# Altium footprint library Inverter_2kW.PcbLib: 61 footprints (part 4 of 4)
Each footprint in its own frame and in the unit in brackets; x right, y up, seen from the top. Pads: shape width x height; smd on the part's side, far side on the other; paste and mask are expansions set on the pad; w line width, h text height; cw(c..) or ccw(c..) is an arc to the next point about the centre after c.
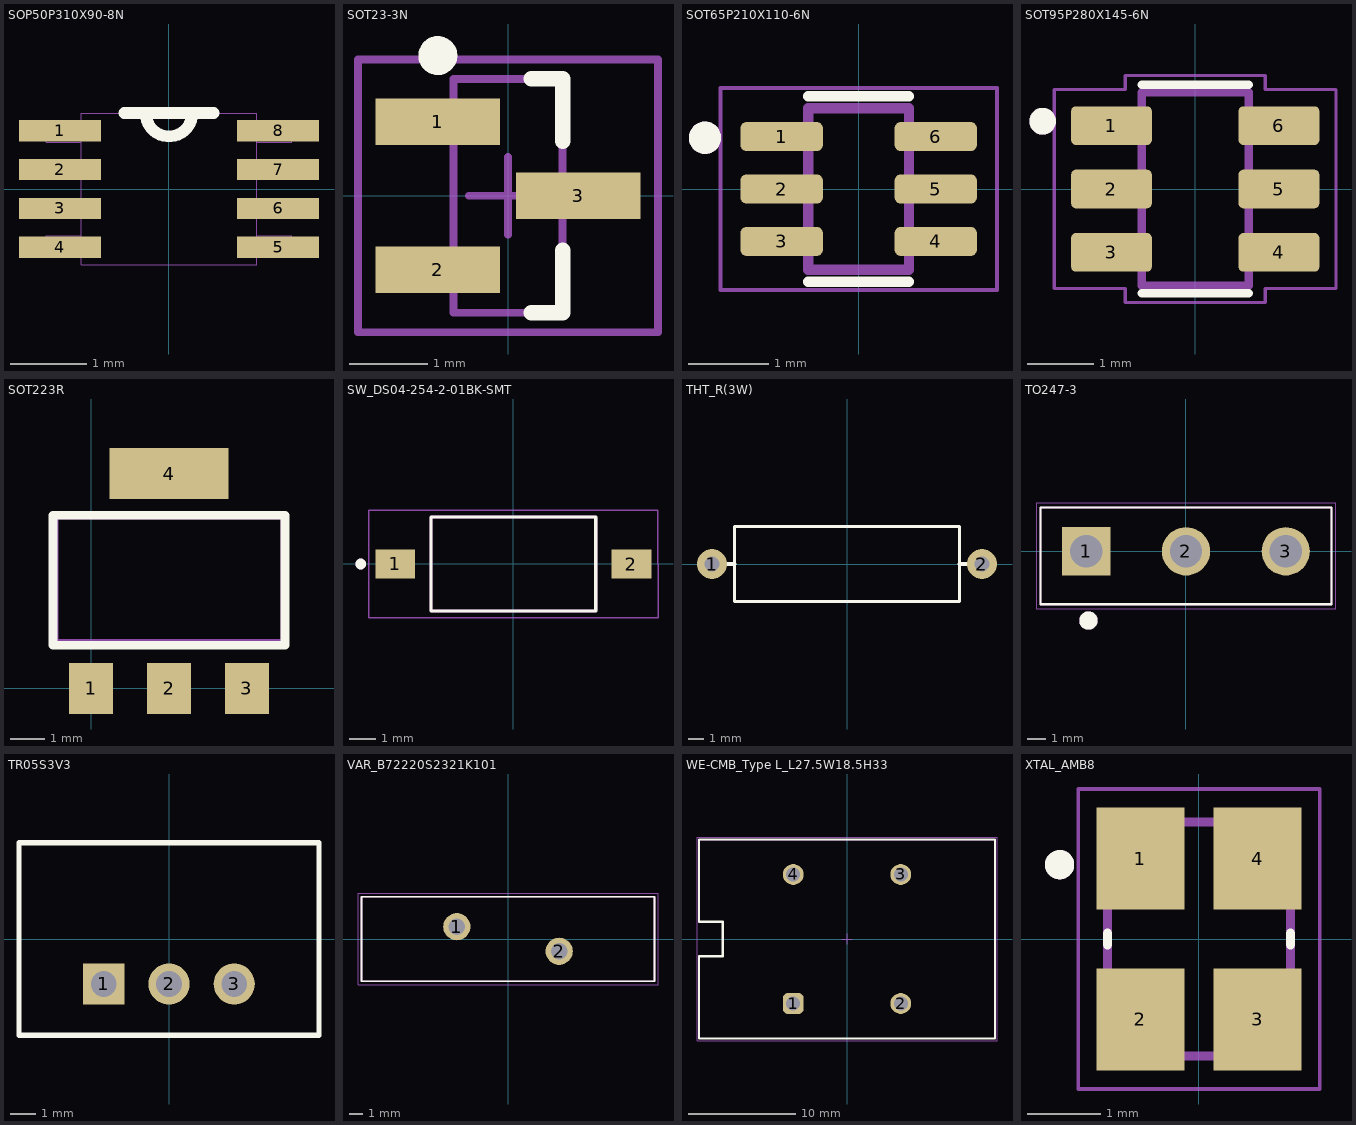
[diagram p3: the footprints below, top view; thin cyan lines are the x and y axes]

## SOP50P310X90-8N [mil]
height 531.5
pads (8):
  rect 42x11 smd: 1(-56,30) 2(-56,10) 3(-56,-10) 4(-56,-30) 5(56,-30) 6(56,-10) 7(56,10) 8(56,30)
Top Overlay:
  lines w6: -23,39 -12,39 ; 23,39 12,39 ; -12,39 ccw(c0,39) 12,39 ; -12,39 12,39
Mechanical 13:
  lines w0: -12,39 ccw(c0,39) 12,39 ; -12,39 -45,39 -45,-39 45,-39 45,39 12,39 ; -12,39 12,39 ; -63,-35 -45,-35 -45,-24 -63,-24 -63,-35 ; -63,-15 -45,-15 -45,-5 -63,-5 -63,-15 ; -63,5 -45,5 -45,15 -63,15 -63,5 ; -63,24 -45,24 -45,35 -63,35 -63,24 ; 45,-35 63,-35 63,-24 45,-24 45,-35 ; 45,-15 63,-15 63,-5 45,-5 45,-15 ; 45,5 63,5 63,15 45,15 45,5 ; 45,24 63,24 63,35 45,35 45,24

## SOT23-3N [mm] "SOT23, 3-Leads, Body 3.0x2.6mm (max), Pitch 0.95mm, IPC Medium Density"
height 1.1
pads (3):
  rect 1.6x0.6 smd: 1(-0.9,0.95) 2(-0.9,-0.95) 3(0.9,0)
Top Overlay:
  circle w0.25: c-0.9,1.8 r0.125
  lines w0.2: 0.3,-1.5 0.7,-1.5 0.7,-0.7 ; 0.3,1.5 0.7,1.5 0.7,0.7
Mechanical 13:
  lines w0.1: -0.7,-1.5 0.7,-1.5 0.7,1.5 -0.7,1.5 -0.7,-1.5
Mechanical 15:
  lines w0.1: -0.5,0 0.5,0 ; 0,-0.5 0,0.5 ; -1.925,-1.75 1.925,-1.75 1.925,1.75 -1.925,1.75 -1.925,-1.75
3D body: height 1.1, standoff 0.1, extent -0.7,-1.5 0.7,1.5
3D body: height 0.55, standoff 0.35, extent -0.864,0.711 -0.61,1.219
3D body: height 0.55, standoff 0.35, extent -0.864,-1.219 -0.66,-0.711
3D body: height 0.55, standoff 0.35, extent 0.66,-0.254 0.864,0.254
3D body: height 0.55, standoff 0, extent 0.864,-0.254 1.067,0.254
3D body: height 0.55, standoff 0, extent -1.067,-1.219 -0.864,-0.711
3D body: height 0.55, standoff 0, extent -1.067,0.711 -0.864,1.219
3D body: height 0.2, standoff 0, extent 1.067,-0.254 1.473,0.254
3D body: height 0.2, standoff 0, extent -1.473,-1.219 -1.067,-0.711
3D body: height 0.2, standoff 0, extent -1.422,0.711 -1.067,1.219

## SOT65P210X110-6N [mm]
pads (6):
  rrect40% 1.02x0.36 smd: 1(-0.955,0.65) 2(-0.955,0) 3(-0.955,-0.65) 4(0.955,-0.65) 5(0.955,0) 6(0.955,0.65)
Top Overlay:
  circle w0.2: c-1.905,0.635 r0.1
  lines w0.127: -0.625,-1.15 0.625,-1.15 ; -0.625,1.15 0.625,1.15
Mechanical 13:
  circle w0.2: c-1.905,0.635 r0.1
  lines w0.127: -0.625,-1 0.625,-1 0.625,1 -0.625,1 -0.625,-1
Mechanical 15:
  lines w0.05: -1.715,-1.25 -1.715,1.25 1.715,1.25 1.715,-1.25 -1.715,-1.25
3D body "NUP4202W1T2G.STEP": height 1.1, standoff 0, extent -1.05,-1 1.05,1

## SOT95P280X145-6N [mm]
pads (6):
  rrect25% 1.21x0.58 smd: 1(-1.255,0.95) 2(-1.255,0) 3(-1.255,-0.95) 4(1.255,-0.95) 5(1.255,0) 6(1.255,0.95)
Top Overlay:
  circle w0.2: c-2.286,1.016 r0.1
  lines w0.127: -0.8,-1.56 0.8,-1.56 ; -0.8,1.56 0.8,1.56
Mechanical 13:
  circle w0.2: c-2.286,1.016 r0.1
  lines w0.127: -0.8,-1.45 0.8,-1.45 0.8,1.45 -0.8,1.45 -0.8,-1.45
Mechanical 15:
  lines w0.05: -2.11,-1.49 -1.05,-1.49 -1.05,-1.7 1.05,-1.7 1.05,-1.49 2.11,-1.49 2.11,1.49 1.05,1.49 1.05,1.7 -1.05,1.7 -1.05,1.49 -2.11,1.49 -2.11,-1.49
3D body "SN74LVC2G07DBVR.STEP": height 1.45, standoff 0, extent -1.4,-1.45 1.4,1.45

## SOT223R [mm]
height 2
pads (4):
  rect 1.3x1.5 smd: 1(0,0) 2(2.286,0) 3(4.572,0)
  rect 3.5x1.5 smd: 4(2.286,6.299)
Top Overlay:
  lines w0.254: -1.116,1.27 5.688,1.27 5.688,5.08 -1.116,5.08 -1.116,1.27
Mechanical 1:
  lines w0.2: -1.05,1.35 5.65,1.35 5.65,5.05 -1.05,5.05 -1.05,1.35
3D body "SW3dPS-sot-223.step": height 1.64, standoff -0.04, extent -1,-0.3 5.5,6.632

## SP900S-0.009-00-90 [mm]

## SW_DS04-254-2-01BK-SMT [mm]
height 4.86
pads (2):
  rect 1.5x1.1 smd: 1(-4.45,0) 2(4.45,0)
Top Overlay:
  circle w0.2: c-5.75,0 r0.1
  lines w0.127: -3.1,-1.77 -3.1,1.77 3.1,1.77 3.1,-1.77 -3.1,-1.77
Mechanical 13:
  circle w0.2: c-5.75,0 r0.1
  lines w0.127: -3.1,-1.77 -3.1,1.77 3.1,1.77 3.1,-1.77 -3.1,-1.77
Mechanical 15:
  lines w0.05: -5.45,-2.02 5.45,-2.02 5.45,2.02 -5.45,2.02 -5.45,-2.02
3D body "CUI_DEVICES_DS04-254-2-01BK-SMT.step": height 3.99, standoff -0.01, extent -4.95,-1.778 4.95,1.762

## THT_R(3W) [mm]
height 1.1
pads (2):
  round 2 hole 1: 1(-9,0) 2(9,0)
Top Overlay:
  lines w0.203: -7.5,-2.5 -7.5,2.5 7.5,2.5 7.5,-2.5 -7.5,-2.5
  lines w0.254: -9,0 -7.5,0 ; 7.5,0 9,0
3D body: height 5.5, standoff 0.5, extent -7.5,-2.494 7.5,2.5

## TO247-3 [mm]
height 13.5
pads (3):
  rect 2.64x2.64 hole 1.76: 1(-5.45,0)
  round 2.64 hole 1.76: 2(0,0) 3(5.45,0)
Top Overlay:
  circle w0.5: c-5.334,-3.785 r0.25
  lines w0.127: -7.95,-2.9 7.95,-2.9 7.95,2.4 -7.95,2.4 -7.95,-2.9
Mechanical 13:
  circle w0.5: c-5.334,-3.785 r0.25
  lines w0.127: -7.95,-2.9 7.95,-2.9 7.95,2.4 -7.95,2.4 -7.95,-2.9
Mechanical 15:
  lines w0.05: -8.2,-3.15 -8.2,2.65 8.2,2.65 8.2,-3.15 -8.2,-3.15
3D body "IRFP90N20DPBF.STEP": height 24.6, standoff -10.5, extent -7.8,-2.333 7.8,2.667

## TR05S3V3 [mm]
height 46
pads (3):
  rect 1.6x1.6 hole 1: 1(-2.54,-1.75)
  round 1.6 hole 1: 2(0,-1.75) 3(2.54,-1.75)
Top Overlay:
  lines w0.2: -5.84,-3.75 5.84,-3.75 5.84,3.75 -5.84,3.75 -5.84,-3.75
3D body: height 10, standoff 0, extent -5.842,-3.81 5.84,3.75

## VAR_B72220S2321K101 [mm]
height 13.5
pads (2):
  round 2 hole 1.2: 1(-3.75,0.9) 2(3.75,-0.9)
Top Overlay:
  lines w0.127: -10.75,-3.1 -10.75,3.1 10.75,3.1 10.75,-3.1 -10.75,-3.1
Mechanical 13:
  lines w0.127: -10.75,-3.1 10.75,-3.1 10.75,3.1 -10.75,3.1 -10.75,-3.1
Mechanical 15:
  lines w0.05: -11,-3.35 11,-3.35 11,3.35 -11,3.35 -11,-3.35

## WE-CMB_Type L_L27.5W18.5H33 [mm] "Common Mode Power Line Choke, 4-Leads, body 27.5x18.5mm"
height 33
pads (4):
  rrect50% 1.95x1.95 hole 1.3: 1(-5,-6)
  round 1.95 hole 1.3: 2(5,-6) 3(5,6) 4(-5,6)
Top Overlay:
  lines w0.2: -13.75,-9.25 13.75,-9.25 13.75,9.25 -13.75,9.25 -13.75,1.6 -11.55,1.6 -11.55,-1.6 -13.75,-1.6 -13.75,-9.25
Mechanical 3:
  text ".Designator" at -7.498,-0.5 h1.5
Mechanical 11:
  lines w0.1: -13.75,-9.25 -13.75,-1.6 -11.55,-1.6 -11.55,1.6 -13.75,1.6 -13.75,9.25 13.75,9.25 13.75,-9.25 -13.75,-9.25
Mechanical 13:
  lines w0.1: -13.75,-9.25 13.75,-9.25 13.75,9.25 -13.75,9.25 -13.75,1.6 -11.55,1.6 -11.55,-1.6 -13.75,-1.6 -13.75,-9.25
Mechanical 15:
  lines w0.05: -0.5,0 0.5,0 ; 0,-0.5 0,0.5 ; -13.95,-9.45 13.95,-9.45 13.95,9.45 -13.95,9.45 -13.95,-9.45
3D body "744824101_L.stp": height 28.88, standoff -4.7, extent -12.398,-8.5 12.398,8.534

## XTAL_AMB8 [mm]
height 0.7
pads (4):
  rect 1.2x1.4 smd: 1(-0.8,1.1) 2(-0.8,-1.1) 3(0.8,-1.1) 4(0.8,1.1)
Top Overlay:
  circle w0.2: c-1.905,1.016 r0.1
  lines w0.127: -1.25,-0.08 -1.25,0.08 ; 1.25,-0.08 1.25,0.08
Mechanical 13:
  circle w0.2: c-1.905,1.016 r0.1
  lines w0.127: -1.25,-1.6 1.25,-1.6 1.25,1.6 -1.25,1.6 -1.25,-1.6
Mechanical 15:
  lines w0.05: -1.65,-2.05 1.65,-2.05 1.65,2.05 -1.65,2.05 -1.65,-2.05
3D body "ABM8-20.000MHZ-10-B1U-T.STEP": height 0.8, standoff 0, extent -1.25,-1.6 1.25,1.6